# Altium footprint library fszhang.PcbLib: 1032 footprints (part 16 of 66)
Each footprint in its own frame and in the unit in brackets; x right, y up, seen from the top. Pads: shape width x height; smd on the part's side, far side on the other; paste and mask are expansions set on the pad; w line width, h text height; cw(c..) or ccw(c..) is an arc to the next point about the centre after c.
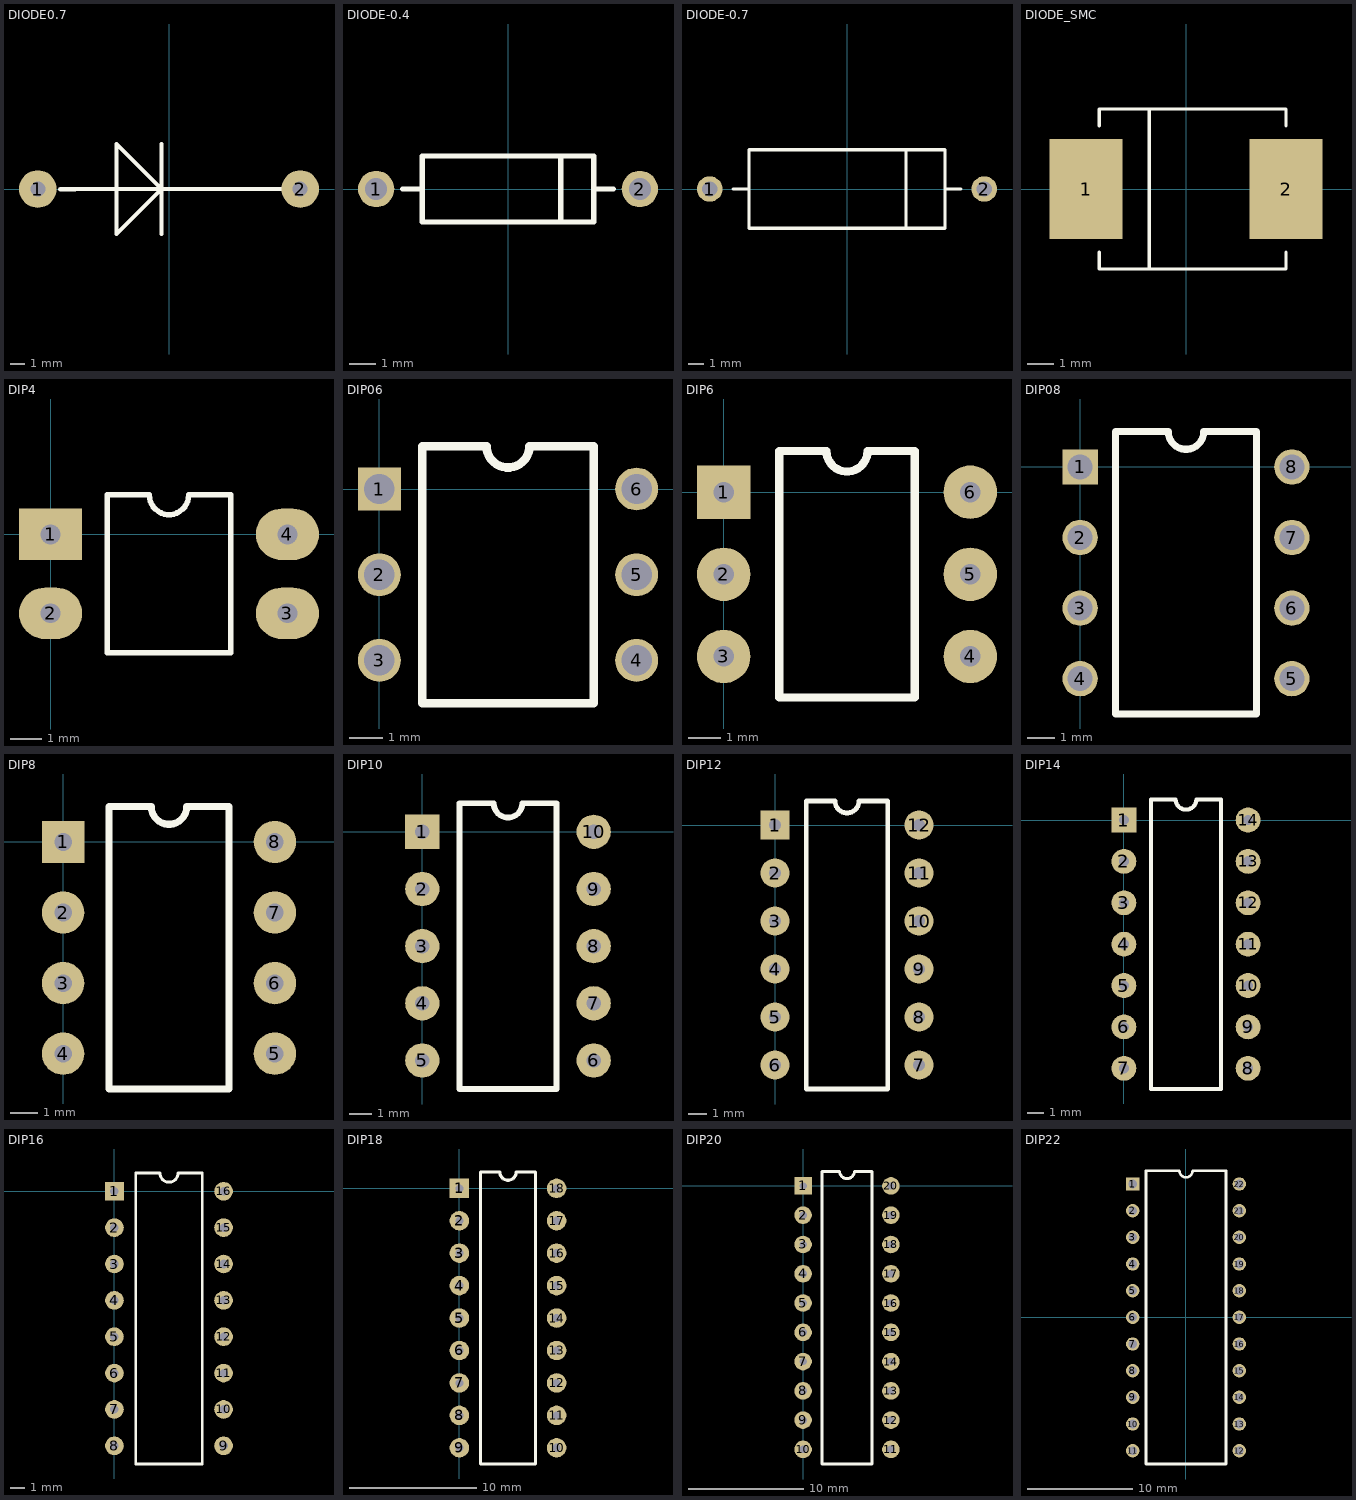
[diagram p15: the footprints below, top view; thin cyan lines are the x and y axes]

## DIODE0.7 [mil]
pads (2):
  round 100 hole 40: 1(-350,0) 2(350,0)
Top Overlay:
  lines w10: -280,0 300,0 -140,0 -140,-120 ; -20,-120 -20,120 -20,0 ; -140,-120 -20,0 ; -140,-120 -20,0 ; -140,-120 -140,120 -20,0
  lines w12: -290,0 -250,0

## DIODE-0.4 [mm] "Tunnel Diode - Dependent Source Model; 2 Leads"
height 2.54
pads (2):
  round 1.4 hole 0.85: 1(-5.08,0) 2(5.08,0)
Top Overlay:
  lines w0.2: -4.064,0 -3.302,0 ; 2.032,-1.27 2.032,1.27 ; 3.302,0 4.064,0 ; -3.302,-1.27 3.302,-1.27 3.302,1.27 -3.302,1.27 -3.302,-1.27

## DIODE-0.7 [mm] "Zener Diode; 2 Leads"
height 5.08
pads (2):
  round 1.65 hole 1: 1(-8.89,0) 2(8.89,0)
Top Overlay:
  lines w0.2: -7.366,0 -6.35,0 ; 3.81,-2.54 3.81,2.54 ; 6.35,0 7.366,0 ; -6.35,-2.54 6.35,-2.54 6.35,2.54 -6.35,2.54 -6.35,-2.54

## DIODE_SMC [mil] "Magnetic-Core Inductor with Winding Polarity Marking; 2 Leads"
pads (2):
  rect 110x150 smd: 1(-150,0) 2(150,0)
Top Overlay:
  lines w5: -130,-95 -130,-120 150,-120 150,-95 ; -130,95 -130,120 150,120 150,95 ; -55,-120 -55,120
Mechanical 1:
  lines w1: -130,-120 150,-120 ; -130,120 150,120

## DIP4 [mil]
pads (4):
  rect 80x65 / inner rect 100x50 / far side rect 80x65 hole 25: 1(0,0)
  oval 80x65 / inner oval 100x50 / far side oval 80x65 hole 25: 2(0,-100) 3(300,-100) 4(300,0)
Top Overlay:
  lines w7: 72,-150 228,-150 228,50 175,50 cw(c150,50) 125,50 72,50 72,-150

## DIP06 [mm]
pads (6):
  rect 1.27x1.27 hole 0.9: 1(0,0)
  round 1.27 hole 0.9: 2(0,-2.54) 3(0,-5.08) 4(7.62,-5.08) 5(7.62,-2.54) 6(7.62,0)
Top Overlay:
  lines w0.254: 1.27,-6.35 1.27,1.27 3.175,1.27 ccw(c3.81,1.27) 4.445,1.27 6.35,1.27 6.35,-6.35 1.27,-6.35

## DIP6 [mil]
pads (6):
  rect 65x65 hole 25: 1(0,0)
  round 65 hole 25: 2(0,-100) 3(0,-200) 4(300,-200) 5(300,-100) 6(300,0)
Top Overlay:
  lines w10: 67.5,-250 232.5,-250 232.5,50 175,50 cw(c150,50) 125,50 67.5,50 67.5,-250

## DIP08 [mm]
pads (8):
  rect 1.27x1.27 hole 0.9: 1(0,0)
  round 1.27 hole 0.9: 2(0,-2.54) 3(0,-5.08) 4(0,-7.62) 5(7.62,-7.62) 6(7.62,-5.08) 7(7.62,-2.54) 8(7.62,0)
Top Overlay:
  lines w0.254: 1.27,-8.89 1.27,1.27 3.175,1.27 ccw(c3.81,1.27) 4.445,1.27 6.35,1.27 6.35,-8.89 1.27,-8.89

## DIP8 [mil]
pads (8):
  rect 60x60 hole 25: 1(0,0)
  round 60 hole 25: 2(0,-100) 3(0,-200) 4(0,-300) 5(300,-300) 6(300,-200) 7(300,-100) 8(300,0)
Top Overlay:
  lines w10: 65,-350 65,50 125,50 ccw(c150,50) 175,50 235,50 235,-350 65,-350

## DIP10 [mil]
pads (10):
  rect 60x60 hole 25: 1(0,0)
  round 60 hole 25: 2(0,-100) 3(0,-200) 4(0,-300) 5(0,-400) 6(300,-400) 7(300,-300) 8(300,-200) 9(300,-100) 10(300,0)
Top Overlay:
  lines w10: 65,-450 65,50 125,50 ccw(c150,50) 175,50 235,50 235,-450 65,-450

## DIP12 [mil]
pads (12):
  rect 60x60 hole 25: 1(0,0)
  round 60 hole 25: 2(0,-100) 3(0,-200) 4(0,-300) 5(0,-400) 6(0,-500) 7(300,-500) 8(300,-400) 9(300,-300) 10(300,-200) 11(300,-100) 12(300,0)
Top Overlay:
  lines w10: 65,-550 65,50 125,50 ccw(c150,50) 175,50 235,50 235,-550 65,-550

## DIP14 [mil]
pads (14):
  rect 60x60 hole 25: 1(0,0)
  round 60 hole 25: 2(0,-100) 3(0,-200) 4(0,-300) 5(0,-400) 6(0,-500) 7(0,-600) 8(300,-600) 9(300,-500) 10(300,-400) 11(300,-300) 12(300,-200) 13(300,-100) 14(300,0)
Top Overlay:
  lines w10: 65,-650 235,-650 235,50 175,50 cw(c150,50) 125,50 65,50 65,-650

## DIP16 [mm]
pads (16):
  rect 1.3x1.3 hole 0.6: 1(0,0)
  round 1.3 hole 0.6: 2(0,-2.54) 3(0,-5.08) 4(0,-7.62) 5(0,-10.16) 6(0,-12.7) 7(0,-15.24) 8(0,-17.78) 9(7.62,-17.78) 10(7.62,-15.24) 11(7.62,-12.7) 12(7.62,-10.16) 13(7.62,-7.62) 14(7.62,-5.08) 15(7.62,-2.54) 16(7.62,0)
Top Overlay:
  lines w0.2: 1.485,-19.05 1.485,1.27 3.175,1.27 ccw(c3.81,1.27) 4.445,1.27 6.135,1.27 6.135,-19.05 1.485,-19.05

## DIP18 [mil]
pads (18):
  rect 60x60 hole 25: 1(0,0)
  round 60 hole 25: 2(0,-100) 3(0,-200) 4(0,-300) 5(0,-400) 6(0,-500) 7(0,-600) 8(0,-700) 9(0,-800) 10(300,-800) 11(300,-700) 12(300,-600) 13(300,-500) 14(300,-400) 15(300,-300) 16(300,-200) 17(300,-100) 18(300,0)
Top Overlay:
  lines w10: 65,-850 235,-850 235,50 175,50 cw(c150,50) 125,50 65,50 65,-850

## DIP20 [mil]
pads (20):
  rect 60x60 hole 25: 1(0,0)
  round 60 hole 25: 2(0,-100) 3(0,-200) 4(0,-300) 5(0,-400) 6(0,-500) 7(0,-600) 8(0,-700) 9(0,-800) 10(0,-900) 11(300,-900) 12(300,-800) 13(300,-700) 14(300,-600) 15(300,-500) 16(300,-400) 17(300,-300) 18(300,-200) 19(300,-100) 20(300,0)
Top Overlay:
  lines w10: 65,-950 65,50 125,50 ccw(c150,50) 175,50 235,50 235,-950 65,-950

## DIP22 [mil]
pads (22):
  rect 50x50 hole 32: 1(-199.29,499.29)
  round 50 hole 32: 2(-199.29,399.29) 3(-199.29,299.29) 4(-199.29,199.29) 5(-199.29,99.29) 6(-199.29,-0.71) 7(-199.29,-100.71) 8(-199.29,-200.71) 9(-199.29,-300.71) 10(-199.29,-400.71) 11(-199.29,-500.71) 12(200.71,-500.71) 13(200.71,-400.71) 14(200.71,-300.71) 15(200.71,-200.71) 16(200.71,-100.71) 17(200.71,-0.71) 18(200.71,99.29) 19(200.71,199.29) 20(200.71,299.29) 21(200.71,399.29) 22(200.71,499.29)
Top Overlay:
  lines w10: -149.29,-550.71 -149.29,549.29 -24.29,549.29 ccw(c0.71,549.29) 25.71,549.29 150.71,549.29 150.71,-550.71 -149.29,-550.71